# Altium footprint library Active.PcbLib: 325 footprints (part 15 of 23)
Each footprint in its own frame and in the unit in brackets; x right, y up, seen from the top. Pads: shape width x height; smd on the part's side, far side on the other; paste and mask are expansions set on the pad; w line width, h text height; cw(c..) or ccw(c..) is an arc to the next point about the centre after c.
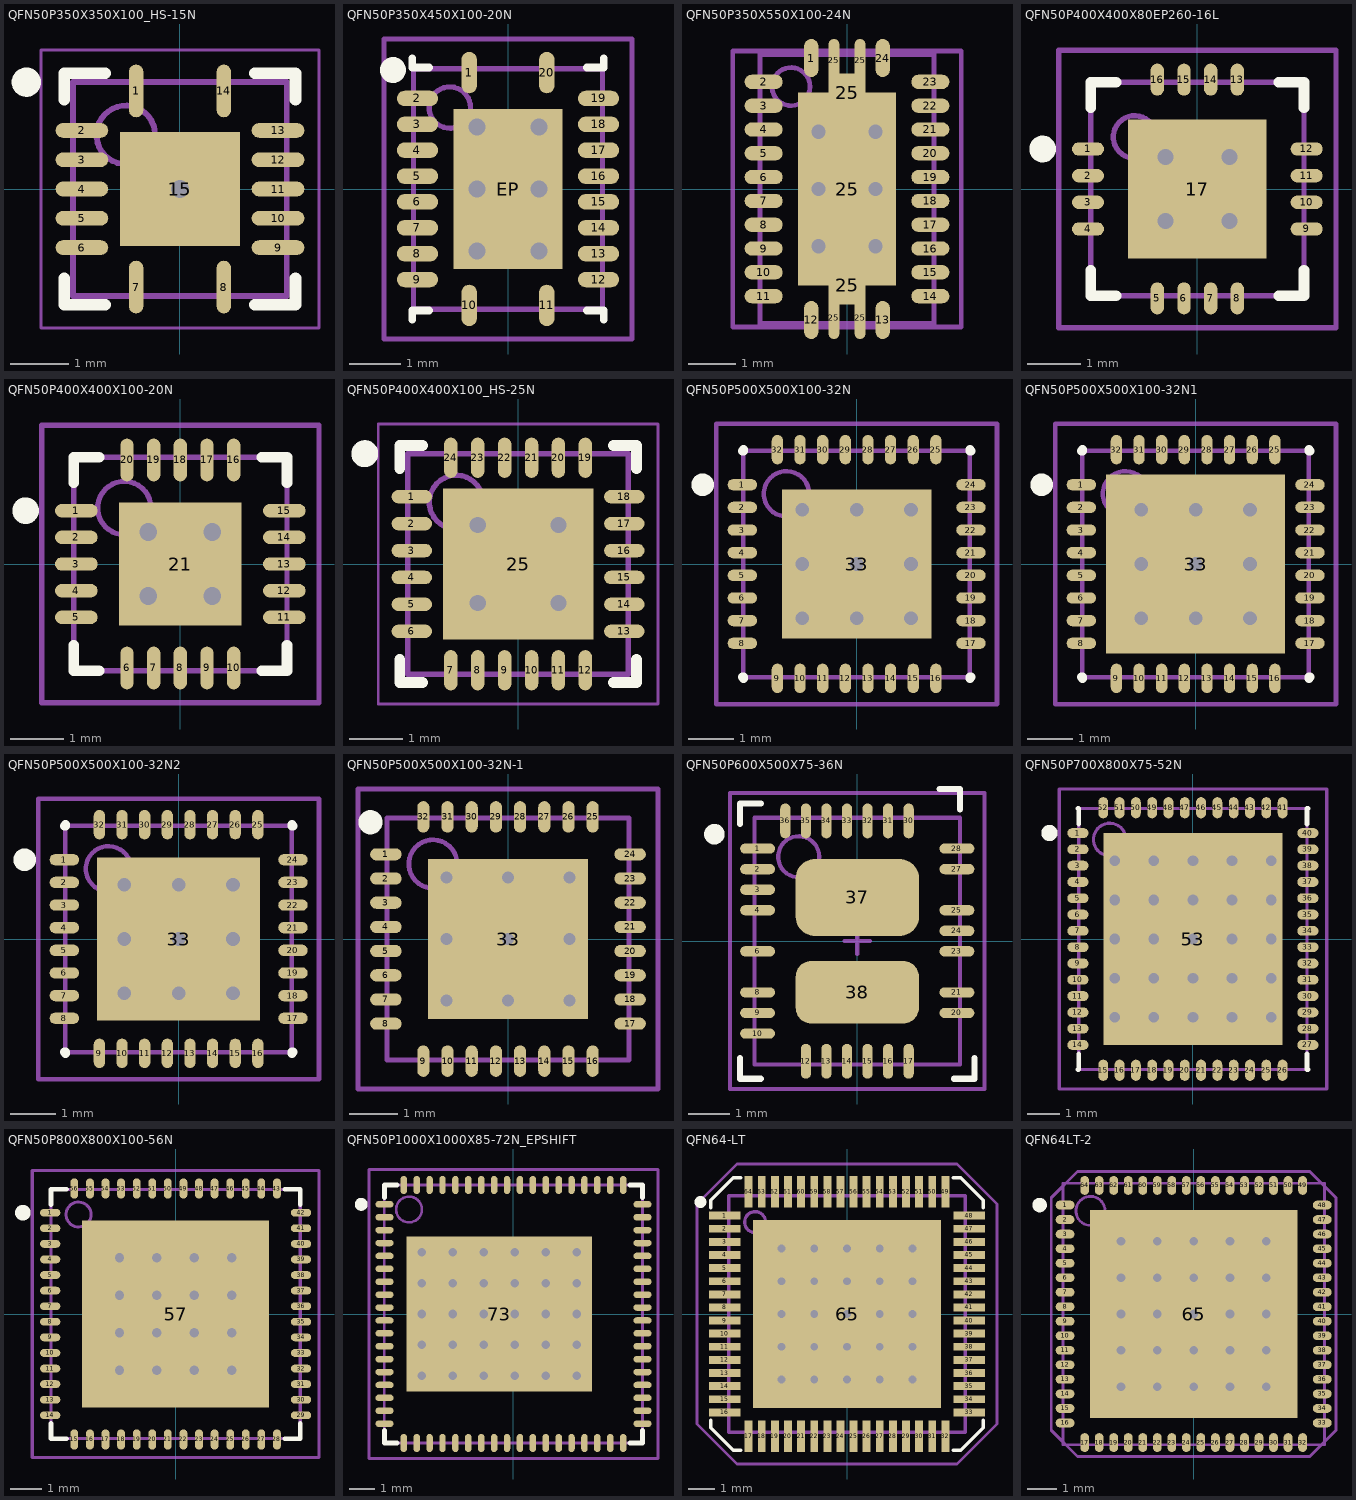
[diagram p14: the footprints below, top view; thin cyan lines are the x and y axes]

## QFN50P350X350X100_HS-15N [mm] "QFN, 14-Leads, Body 3,50x3,50mm, Pitch 1,50mm/0,50mm, Thermal Pad 2,05x1,95mm, IPC Medium Density"
height 1
pads (15):
  oval 0.25x0.9 smd: 1(-0.75,1.675) 7(-0.75,-1.675) 8(0.75,-1.675) 14(0.75,1.675)
  oval 0.9x0.25 smd: 2(-1.675,1) 3(-1.675,0.5) 4(-1.675,0) 5(-1.675,-0.5) 6(-1.675,-1) 9(1.675,-1) 10(1.675,-0.5) 11(1.675,0) 12(1.675,0.5) 13(1.675,1)
  rect 2.05x1.95 smd paste-5: 15(0,0)
via 0,0 diameter 0.65 hole 0.3
Top Overlay:
  circle w0.25: c-2.625,1.825 r0.125
  lines w0.2: -1.975,-1.525 -1.975,-1.975 -1.275,-1.975 ; -1.975,1.525 -1.975,1.975 -1.275,1.975 ; 1.275,-1.975 1.975,-1.975 1.975,-1.525 ; 1.275,1.975 1.975,1.975 1.975,1.525
Top Paste:
  region: 1.025,0.15 0.325,0.15 0.125,0.35 0.125,0.975 1.025,0.975
  region: 1.025,-0.15 0.325,-0.15 0.125,-0.35 0.125,-0.975 1.025,-0.975
  region: -1.025,-0.15 -0.325,-0.15 -0.125,-0.35 -0.125,-0.975 -1.025,-0.975
  region: -1.025,0.15 -0.325,0.15 -0.125,0.35 -0.125,0.975 -1.025,0.975
Mechanical 13:
  circle w0.1: c-0.925,0.925 r0.5
  lines w0.1: -1.825,-1.825 -1.825,1.825 1.825,1.825 1.825,-1.825 -1.825,-1.825
Mechanical 15:
  lines w0.05: -2.375,-2.375 -2.375,2.375 2.375,2.375 2.375,-2.375 -2.375,-2.375
  lines w0.1: -0.5,0 0.5,0 ; 0,-0.5 0,0.5
3D body: height 1.01, standoff 1, extent -1.5,0.9 -0.9,1.5
3D body: height 1, standoff 0.01, extent -1.825,-1.825 1.825,1.825

## QFN50P350X450X100-20N [mm] "QFN, 20-Leads, Body 4,7x3,7mm (max), Pitch 0,50mm, IPC Medium Density"
height 1
pads (21):
  oval 0.3x0.8 smd mask+0.051: 1(-0.75,2.25) 10(-0.75,-2.25) 11(0.75,-2.25) 20(0.75,2.25)
  oval 0.8x0.3 smd mask+0.051: 2(-1.75,1.75) 3(-1.75,1.25) 4(-1.75,0.75) 5(-1.75,0.25) 6(-1.75,-0.25) 7(-1.75,-0.75) 8(-1.75,-1.25) 9(-1.75,-1.75) 12(1.75,-1.75) 13(1.75,-1.25) 14(1.75,-0.75) 15(1.75,-0.25) 16(1.75,0.25) 17(1.75,0.75) 18(1.75,1.25) 19(1.75,1.75)
  rect 2.1x3.1 smd: EP(0,0)
via -0.6,1.2 diameter 0.66 hole 0.33
via 0.6,1.2 diameter 0.66 hole 0.33
via -0.6,0 diameter 0.66 hole 0.33
via 0.6,0 diameter 0.66 hole 0.33
via -0.6,-1.2 diameter 0.66 hole 0.33
via 0.6,-1.2 diameter 0.66 hole 0.33
Top Overlay:
  circle w0.25: c-2.225,2.3 r0.125
  lines w0.15: -1.85,-2.525 -1.85,-2.35 -1.525,-2.35 ; -1.85,2.525 -1.85,2.35 -1.525,2.35 ; 1.525,-2.35 1.85,-2.35 1.85,-2.525 ; 1.525,2.35 1.85,2.35 1.85,2.525
Mechanical 13:
  circle w0.1: c-1.125,1.575 r0.4
  lines w0.1: -1.825,-2.325 -1.825,2.325 1.825,2.325 1.825,-2.325 -1.825,-2.325
Mechanical 15:
  lines w0.1: -0.5,0 0.5,0 ; 0,-0.5 0,0.5 ; -2.4,-2.9 -2.4,2.9 2.4,2.9 2.4,-2.9 -2.4,-2.9
3D body: height 1, standoff 0.01, extent -1.825,-2.325 1.825,2.325
3D body: height 1.01, standoff 1, extent -1.525,1.175 -0.725,1.975

## QFN50P350X550X100-24N [mm] "QFN, 20-Leads, Body 5,5x3,5mm (max), Pitch 0,50mm, IPC Medium Density"
height 1
pads (31):
  oval 0.3x0.8 smd mask+0.051: 1(-0.75,2.75) 12(-0.75,-2.75) 13(0.75,-2.75) 24(0.75,2.75)
  oval 0.8x0.3 smd mask+0.051: 2(-1.75,2.25) 3(-1.75,1.75) 4(-1.75,1.25) 5(-1.75,0.75) 6(-1.75,0.25) 7(-1.75,-0.25) 8(-1.75,-0.75) 9(-1.75,-1.25) 10(-1.75,-1.75) 11(-1.75,-2.25) 14(1.75,-2.25) 15(1.75,-1.75) 16(1.75,-1.25) 17(1.75,-0.75) 18(1.75,-0.25) 19(1.75,0.25) 20(1.75,0.75) 21(1.75,1.25) 22(1.75,1.75) 23(1.75,2.25)
  oval 0.23x0.9 smd mask+0.051: 25(-0.275,-2.7) 25(-0.275,2.7) 25(0.275,-2.7) 25(0.275,2.7)
  rect 0.78x0.8 smd paste-7 mask+0.051: 25(0,-2.025) 25(0,2.025)
  rect 2.05x4.05 smd paste-7 mask-7: 25(0,0)
via 0.6,-1.2 diameter 0.65 hole 0.3
via -0.6,-1.2 diameter 0.65 hole 0.3
via 0.6,0 diameter 0.65 hole 0.3
via -0.6,0 diameter 0.65 hole 0.3
via 0.6,1.2 diameter 0.65 hole 0.3
via -0.6,1.2 diameter 0.65 hole 0.3
Top Paste:
  region: -1.025,0.825 1.025,0.825 1.025,0.2 0.875,0.2 0.75,0.325 0.45,0.325 0.325,0.2 -0.325,0.2 -0.45,0.325 -0.75,0.325 -0.875,0.2 -1.025,0.2
  region: -1.025,-0.375 1.025,-0.375 1.025,-1 0.875,-1 0.75,-0.875 0.45,-0.875 0.325,-1 -0.325,-1 -0.45,-0.875 -0.75,-0.875 -0.875,-1 -1.025,-1
  region: -1.025,-0.825 1.025,-0.825 1.025,-0.2 0.875,-0.2 0.75,-0.325 0.45,-0.325 0.325,-0.2 -0.325,-0.2 -0.45,-0.325 -0.75,-0.325 -0.875,-0.2 -1.025,-0.2
  region: -1.025,0.375 1.025,0.375 1.025,1 0.875,1 0.75,0.875 0.45,0.875 0.325,1 -0.325,1 -0.45,0.875 -0.75,0.875 -0.875,1 -1.025,1
  region: -1.025,-2.025 1.025,-2.025 1.025,-1.4 0.875,-1.4 0.75,-1.525 0.45,-1.525 0.325,-1.4 -0.325,-1.4 -0.45,-1.525 -0.75,-1.525 -0.875,-1.4 -1.025,-1.4
  region: -1.025,2.025 1.025,2.025 1.025,1.4 0.875,1.4 0.75,1.525 0.45,1.525 0.325,1.4 -0.325,1.4 -0.45,1.525 -0.75,1.525 -0.875,1.4 -1.025,1.4
Top Solder:
  circle w0.1: c0.6,-1.2 r0.4
  circle w0.1: c-0.6,-1.2 r0.4
  circle w0.1: c-0.6,0 r0.4
  circle w0.1: c0.6,0 r0.4
  circle w0.1: c0.6,1.2 r0.4
  circle w0.1: c-0.6,1.2 r0.4
  region: 1.075,0.6 1.075,-0.6 0,-0.6 0,0.6 0.538,0.6 0.538,0.413 0.5,0.375 0.4,0.375 0.2,0.175 0.2,-0.175 0.425,-0.4 0.75,-0.4 0.975,-0.175 0.975,0.175 0.75,0.4 0.575,0.4 0.538,0.437 0.538,0.6
  region: -1.075,0.6 -1.075,-0.6 0,-0.6 0,0.6 -0.537,0.6 -0.537,0.413 -0.5,0.375 -0.4,0.375 -0.2,0.175 -0.2,-0.175 -0.425,-0.4 -0.75,-0.4 -0.975,-0.175 -0.975,0.175 -0.75,0.4 -0.575,0.4 -0.537,0.437 -0.537,0.6
  region: -0.425,-2.075 -1.075,-2.075 -1.075,-0.6 0,-0.6 0,-2.075 -0.425,-2.075 -0.425,-1.55 -0.6,-1.6 -0.875,-1.475 -1.025,-1.25 -0.9,-0.975 -0.775,-0.85 -0.475,-0.825 -0.275,-1 -0.2,-1.2 -0.275,-1.45 -0.425,-1.55
  region: 0.425,-2.075 1.075,-2.075 1.075,-0.6 0,-0.6 0,-2.075 0.425,-2.075 0.425,-1.55 0.6,-1.6 0.875,-1.475 1.025,-1.25 0.9,-0.975 0.775,-0.85 0.475,-0.825 0.275,-1 0.2,-1.2 0.275,-1.45 0.425,-1.55
  region: 0.425,2.075 1.075,2.075 1.075,0.6 0,0.6 0,2.075 0.425,2.075 0.425,1.55 0.6,1.6 0.875,1.475 1.025,1.25 0.9,0.975 0.775,0.85 0.475,0.825 0.275,1 0.2,1.2 0.275,1.45 0.425,1.55
  region: -0.425,2.075 -1.075,2.075 -1.075,0.6 0,0.6 0,2.075 -0.425,2.075 -0.425,1.55 -0.6,1.6 -0.875,1.475 -1.025,1.25 -0.9,0.975 -0.775,0.85 -0.475,0.825 -0.275,1 -0.2,1.2 -0.275,1.45 -0.425,1.55
Mechanical 13:
  circle w0.1: c-1.175,2.15 r0.4
  lines w0.1: -1.825,-2.825 1.825,-2.825 1.825,2.825 -1.825,2.825 -1.825,-2.825
Mechanical 15:
  lines w0.1: -0.5,0 0.5,0 ; 0,-0.5 0,0.5 ; -2.4,-2.9 2.4,-2.9 2.4,2.9 -2.4,2.9 -2.4,-2.9
3D body: height 1.01, standoff 1, extent -1.575,1.75 -0.775,2.55
3D body: height 1, standoff 0.01, extent -1.825,-2.825 1.825,2.825

## QFN50P400X400X80EP260-16L [mm] "QFN, 16-Leads, Body 4,0x4,0mm (max), Pitch 0,50mm, IPC Medium Density"
height 0.8
pads (17):
  oval 0.6x0.25 smd mask+0.051: 1(-2.05,0.75) 2(-2.05,0.25) 3(-2.05,-0.25) 4(-2.05,-0.75) 9(2.05,-0.75) 10(2.05,-0.25) 11(2.05,0.25) 12(2.05,0.75)
  oval 0.25x0.6 smd mask+0.051: 5(-0.75,-2.05) 6(-0.25,-2.05) 7(0.25,-2.05) 8(0.75,-2.05) 13(0.75,2.05) 14(0.25,2.05) 15(-0.25,2.05) 16(-0.75,2.05)
  rect 2.6x2.6 smd paste-2 mask-2: 17(0,0)
via 0.6,-0.6 diameter 0.65 hole 0.3
via -0.6,-0.6 diameter 0.65 hole 0.3
via 0.6,0.6 diameter 0.65 hole 0.3
via -0.6,0.6 diameter 0.65 hole 0.3
Top Overlay:
  circle w0.25: c-2.9,0.75 r0.125
  lines w0.2: -2,-1.525 -2,-2 -1.525,-2 ; -2,1.525 -2,2 -1.525,2 ; 1.525,-2 2,-2 2,-1.525 ; 1.525,2 2,2 2,1.525
Top Paste:
  region: 1.3,1.3 1.3,0.75 0.925,0.75 0.75,0.925 0.75,1.3
  region: 1.3,-1.3 0.75,-1.3 0.75,-0.925 0.925,-0.75 1.3,-0.75
  region: -1.3,-1.3 -1.3,-0.75 -0.925,-0.75 -0.75,-0.925 -0.75,-1.3
  region: 0.45,1.3 0.45,0.925 0.275,0.75 -0.275,0.75 -0.45,0.925 -0.45,1.3
  region: 1.3,-0.45 0.925,-0.45 0.75,-0.275 0.75,0.275 0.925,0.45 1.3,0.45
  region: -0.45,-1.3 -0.45,-0.925 -0.275,-0.75 0.275,-0.75 0.45,-0.925 0.45,-1.3
  region: -1.3,1.3 -0.75,1.3 -0.75,0.925 -0.925,0.75 -1.3,0.75
  region: -0.45,0.275 -0.275,0.45 0.275,0.45 0.45,0.275 0.45,-0.275 0.275,-0.45 -0.275,-0.45 -0.45,-0.275
  region: -1.3,0.45 -0.925,0.45 -0.75,0.275 -0.75,-0.275 -0.925,-0.45 -1.3,-0.45
Top Solder:
  region: -1.35,1.35 -0.6,1.35 -0.6,0.925 -0.632,0.925 -0.727,0.906 -0.834,0.834 -0.906,0.727 -0.925,0.632 -0.925,0.6 -0.925,0.568 -0.906,0.473 -0.834,0.366 -0.727,0.294 -0.632,0.275 -0.6,0.275 -0.568,0.275 -0.473,0.294 -0.366,0.366 -0.294,0.473 -0.275,0.568 -0.275,0.6 -0.275,0.632 -0.294,0.727 -0.366,0.834 -0.473,0.906 -0.568,0.925 -0.6,0.925 -0.6,1.35 0,1.35 0,0 -1.35,0
  region: -1.35,-1.35 -1.35,-0.6 -0.925,-0.6 -0.925,-0.632 -0.906,-0.727 -0.834,-0.834 -0.727,-0.906 -0.632,-0.925 -0.6,-0.925 -0.568,-0.925 -0.473,-0.906 -0.366,-0.834 -0.294,-0.727 -0.275,-0.632 -0.275,-0.6 -0.275,-0.568 -0.294,-0.473 -0.366,-0.366 -0.473,-0.294 -0.568,-0.275 -0.6,-0.275 -0.632,-0.275 -0.727,-0.294 -0.834,-0.366 -0.906,-0.473 -0.925,-0.568 -0.925,-0.6 -1.35,-0.6 -1.35,0 0,0 0,-1.35
  region: 1.35,-1.35 0.6,-1.35 0.6,-0.925 0.632,-0.925 0.727,-0.906 0.834,-0.834 0.906,-0.727 0.925,-0.632 0.925,-0.6 0.925,-0.568 0.906,-0.473 0.834,-0.366 0.727,-0.294 0.632,-0.275 0.6,-0.275 0.568,-0.275 0.473,-0.294 0.366,-0.366 0.294,-0.473 0.275,-0.568 0.275,-0.6 0.275,-0.632 0.294,-0.727 0.366,-0.834 0.473,-0.906 0.568,-0.925 0.6,-0.925 0.6,-1.35 0,-1.35 0,0 1.35,0
  region: 1.35,1.35 1.35,0.6 0.925,0.6 0.925,0.632 0.906,0.727 0.834,0.834 0.727,0.906 0.632,0.925 0.6,0.925 0.568,0.925 0.473,0.906 0.366,0.834 0.294,0.727 0.275,0.632 0.275,0.6 0.275,0.568 0.294,0.473 0.366,0.366 0.473,0.294 0.568,0.275 0.6,0.275 0.632,0.275 0.727,0.294 0.834,0.366 0.906,0.473 0.925,0.568 0.925,0.6 1.35,0.6 1.35,0 0,0 0,1.35
Mechanical 13:
  circle w0.1: c-1.175,0.975 r0.4
  lines w0.1: -2,-2 2,-2 2,2 -2,2 -2,-2
Mechanical 15:
  lines w0.1: -0.5,0 0.5,0 ; 0,-0.5 0,0.5 ; -2.6,-2.6 2.6,-2.6 2.6,2.6 -2.6,2.6 -2.6,-2.6
3D body: height 0.8, standoff 0.01, extent -2,-2 2,2
3D body: height 0.81, standoff 0.8, extent -1.573,0.56 -0.775,1.373

## QFN50P400X400X100-20N [mm] "QFN, 20-Leads, Body 4,0x4,0mm (max), Pitch 0,50mm, IPC Medium Density"
height 1
pads (21):
  oval 0.8x0.25 smd mask+0.07: 1(-1.95,1) 2(-1.95,0.5) 3(-1.95,0) 4(-1.95,-0.5) 5(-1.95,-1) 11(1.95,-1) 12(1.95,-0.5) 13(1.95,0) 14(1.95,0.5) 15(1.95,1)
  oval 0.25x0.8 smd mask+0.07: 6(-1,-1.95) 7(-0.5,-1.95) 8(0,-1.95) 9(0.5,-1.95) 10(1,-1.95) 16(1,1.95) 17(0.5,1.95) 18(0,1.95) 19(-0.5,1.95) 20(-1,1.95)
  rect 2.3x2.3 smd paste-7 mask-7: 21(0,0)
via 0.6,-0.6 diameter 0.66 hole 0.33
via -0.6,-0.6 diameter 0.66 hole 0.33
via 0.6,0.6 diameter 0.66 hole 0.33
via -0.6,0.6 diameter 0.66 hole 0.33
Top Overlay:
  circle w0.25: c-2.9,1 r0.125
  lines w0.2: -2,-1.525 -2,-2 -1.525,-2 ; -2,1.525 -2,2 -1.525,2 ; 1.525,-2 2,-2 2,-1.525 ; 1.525,2 2,2 2,1.525
Top Paste:
  region: -1.27,1.27 -0.686,1.27 -0.686,0.991 -0.965,0.711 -1.27,0.711
  region: 1.27,1.27 0.686,1.27 0.686,0.991 0.965,0.711 1.27,0.711
  region: 1.27,-1.27 0.686,-1.27 0.686,-0.991 0.965,-0.711 1.27,-0.711
  region: -1.27,-1.27 -0.686,-1.27 -0.686,-0.991 -0.965,-0.711 -1.27,-0.711
  region: -0.508,1.27 -0.508,0.991 -0.229,0.711 0.229,0.711 0.508,0.991 0.508,1.27
  region: -0.508,-1.27 -0.508,-0.991 -0.229,-0.711 0.229,-0.711 0.508,-0.991 0.508,-1.27
  region: 1.27,-0.508 0.991,-0.508 0.711,-0.229 0.711,0.229 0.991,0.508 1.27,0.508
  region: -1.27,-0.508 -0.991,-0.508 -0.711,-0.229 -0.711,0.229 -0.991,0.508 -1.27,0.508
  region: -0.203,0.533 0.203,0.533 0.457,0.279 0.457,-0.254 0.203,-0.508 -0.203,-0.508 -0.457,-0.254 -0.457,0.279
Top Solder:
  circle w0.1: c-0.6,0.6 r0.4
  circle w0.1: c0.6,0.6 r0.4
  circle w0.1: c0.6,-0.6 r0.4
  circle w0.1: c-0.6,-0.6 r0.4
  region: -1.27,1.27 0,1.27 0,0 -1.27,0 -1.27,0.508 -1.016,0.508 -0.889,0.33 -0.787,0.254 -0.66,0.178 -0.559,0.178 -0.432,0.254 -0.254,0.381 -0.2,0.6 -0.229,0.762 -0.305,0.889 -0.457,0.991 -0.66,0.991 -0.838,0.914 -0.991,0.737 -0.991,0.508 -1.27,0.508
  region: 1.27,1.27 0,1.27 0,0 1.27,0 1.27,0.508 1.016,0.508 0.889,0.33 0.787,0.254 0.66,0.178 0.559,0.178 0.432,0.254 0.254,0.381 0.2,0.6 0.229,0.762 0.305,0.889 0.457,0.991 0.66,0.991 0.838,0.914 0.991,0.737 0.991,0.508 1.27,0.508
  region: 1.27,-1.27 0,-1.27 0,0 1.27,0 1.27,-0.508 1.016,-0.508 0.889,-0.33 0.787,-0.254 0.66,-0.178 0.559,-0.178 0.432,-0.254 0.254,-0.381 0.2,-0.6 0.229,-0.762 0.305,-0.889 0.457,-0.991 0.66,-0.991 0.838,-0.914 0.991,-0.737 0.991,-0.508 1.27,-0.508
  region: -1.27,-1.27 0,-1.27 0,0 -1.27,0 -1.27,-0.508 -1.016,-0.508 -0.889,-0.33 -0.787,-0.254 -0.66,-0.178 -0.559,-0.178 -0.432,-0.254 -0.254,-0.381 -0.2,-0.6 -0.229,-0.762 -0.305,-0.889 -0.457,-0.991 -0.66,-0.991 -0.838,-0.914 -0.991,-0.737 -0.991,-0.508 -1.27,-0.508
Mechanical 13:
  circle w0.1: c-1.05,1.05 r0.5
  lines w0.1: -2,-2 2,-2 2,2 -2,2 -2,-2
Mechanical 15:
  lines w0.1: -0.5,0 0.5,0 ; 0,-0.5 0,0.5 ; -2.6,-2.6 2.6,-2.6 2.6,2.6 -2.6,2.6 -2.6,-2.6
3D body: height 1.01, standoff 1, extent -1.575,0.925 -0.975,1.525
3D body: height 1, standoff 0.01, extent -2,-2 2,2

## QFN50P400X400X100_HS-25N [mm] "QFN, 24-Leads, Body 4.00x4.00mm, Pitch 0.50mm, Thermal Pad 2.80x2.100mm, IPC Medium Density"
height 1
pads (25):
  oval 0.75x0.25 smd mask+0.075: 1(-1.975,1.25) 2(-1.975,0.75) 3(-1.975,0.25) 4(-1.975,-0.25) 5(-1.975,-0.75) 6(-1.975,-1.25) 13(1.975,-1.25) 14(1.975,-0.75) 15(1.975,-0.25) 16(1.975,0.25) 17(1.975,0.75) 18(1.975,1.25)
  oval 0.25x0.75 smd mask+0.075: 7(-1.25,-1.975) 8(-0.75,-1.975) 9(-0.25,-1.975) 10(0.25,-1.975) 11(0.75,-1.975) 12(1.25,-1.975) 19(1.25,1.975) 20(0.75,1.975) 21(0.25,1.975) 22(-0.25,1.975) 23(-0.75,1.975) 24(-1.25,1.975)
  rect 2.8x2.8 smd paste-5 mask-5: 25(0,0)
via 0.75,-0.725 diameter 0.65 hole 0.3
via -0.75,-0.725 diameter 0.65 hole 0.3
via 0.75,0.725 diameter 0.65 hole 0.3
via -0.75,0.725 diameter 0.65 hole 0.3
Top Overlay:
  circle w0.25: c-2.85,2.05 r0.125
  lines w0.2: -2.2,-1.775 -2.2,-2.2 -1.775,-2.2 ; -2.2,1.775 -2.2,2.2 -1.775,2.2 ; 1.775,-2.2 2.2,-2.2 2.2,-1.775 ; 1.775,2.2 2.2,2.2 2.2,1.775
Top Paste:
  region: 0.1,-0.65 -0.375,-0.65 -0.675,-0.35 -0.675,-0.05 0.1,-0.05
  region: -1.4,-0.65 -1.125,-0.65 -0.825,-0.35 -0.825,-0.05 -1.4,-0.05
  region: -1.4,-0.8 -1.125,-0.8 -0.825,-1.1 -0.825,-1.4 -1.4,-1.4
  region: 0.1,-0.8 -0.375,-0.8 -0.675,-1.1 -0.675,-1.4 0.1,-1.4
  region: 1.4,-0.65 1.125,-0.65 0.825,-0.35 0.825,-0.05 1.4,-0.05
  region: 0.1,-0.65 0.375,-0.65 0.675,-0.35 0.675,-0.05 0.1,-0.05
  region: 0.1,-0.8 0.375,-0.8 0.675,-1.1 0.675,-1.4 0.1,-1.4
  region: 1.4,-0.8 1.125,-0.8 0.825,-1.1 0.825,-1.4 1.4,-1.4
  region: 1.4,0.8 1.125,0.8 0.825,1.1 0.825,1.4 1.4,1.4
  region: -0.1,0.8 0.375,0.8 0.675,1.1 0.675,1.4 -0.1,1.4
  region: 0.1,0.65 0.375,0.65 0.675,0.35 0.675,-0.05 0.1,-0.05
  region: 1.4,0.65 1.125,0.65 0.825,0.35 0.825,-0.05 1.4,-0.05
  region: -1.4,0.65 -1.125,0.65 -0.825,0.35 -0.825,-0.05 -1.4,-0.05
  region: 0.1,0.65 -0.375,0.65 -0.675,0.35 -0.675,-0.05 0.1,-0.05
  region: -0.1,0.8 -0.375,0.8 -0.675,1.1 -0.675,1.4 -0.1,1.4
  region: -1.4,0.8 -1.125,0.8 -0.825,1.1 -0.825,1.4 -1.4,1.4
Top Solder:
  drawing of 8 lines, arcs and shapes, not listed
Mechanical 13:
  circle w0.1: c-1.15,1.15 r0.5
  lines w0.1: -2.05,-2.05 -2.05,2.05 2.05,2.05 2.05,-2.05 -2.05,-2.05
Mechanical 15:
  lines w0.05: -2.6,-2.6 -2.6,2.6 2.6,2.6 2.6,-2.6 -2.6,-2.6
  lines w0.1: -0.5,0 0.5,0 ; 0,-0.5 0,0.5
3D body: height 1, standoff 0.05, extent -2.05,-2.05 2.05,2.05
3D body: height 1.01, standoff 1, extent -1.649,0.625 -0.65,1.625

## QFN50P500X500X100-32N [mm] "QFN, 32-Leads, Body 5,0x5,0mm (max), Pitch 0,50mm, IPC Medium Density"
height 1
pads (33):
  oval 0.65x0.25 smd mask+0.051: 1(-2.525,1.75) 2(-2.525,1.25) 3(-2.525,0.75) 4(-2.525,0.25) 5(-2.525,-0.25) 6(-2.525,-0.75) 7(-2.525,-1.25) 8(-2.525,-1.75) 17(2.525,-1.75) 18(2.525,-1.25) 19(2.525,-0.75) 20(2.525,-0.25) 21(2.525,0.25) 22(2.525,0.75) 23(2.525,1.25) 24(2.525,1.75)
  oval 0.25x0.65 smd mask+0.051: 9(-1.75,-2.525) 10(-1.25,-2.525) 11(-0.75,-2.525) 12(-0.25,-2.525) 13(0.25,-2.525) 14(0.75,-2.525) 15(1.25,-2.525) 16(1.75,-2.525) 25(1.75,2.525) 26(1.25,2.525) 27(0.75,2.525) 28(0.25,2.525) 29(-0.25,2.525) 30(-0.75,2.525) 31(-1.25,2.525) 32(-1.75,2.525)
  rect 3.3x3.3 smd paste-7 mask-7: 33(0,0)
via -1.2,1.2 diameter 0.65 hole 0.3
via 0,1.2 diameter 0.65 hole 0.3
via 1.2,1.2 diameter 0.65 hole 0.3
via -1.2,0 diameter 0.65 hole 0.3
via 0,0 diameter 0.65 hole 0.3
via 1.2,0 diameter 0.65 hole 0.3
via -1.2,-1.2 diameter 0.65 hole 0.3
via 0,-1.2 diameter 0.65 hole 0.3
via 1.2,-1.2 diameter 0.65 hole 0.3
Top Overlay:
  circle w0.25: c-3.4,1.75 r0.125
  lines w0.2: -2.525,-2.5 -2.5,-2.5 -2.5,-2.525 ; -2.525,2.5 -2.5,2.5 -2.5,2.525 ; 2.5,-2.525 2.5,-2.5 2.525,-2.5 ; 2.5,2.525 2.5,2.5 2.525,2.5
Top Paste:
  region: -1.041,0.914 -0.889,1.067 -0.305,1.067 -0.152,0.914 -0.152,0.279 -0.305,0.127 -0.889,0.127 -1.041,0.279
  region: 1.041,0.914 0.889,1.067 0.305,1.067 0.152,0.914 0.152,0.279 0.305,0.127 0.889,0.127 1.041,0.279
  region: 1.041,-0.914 0.889,-1.067 0.305,-1.067 0.152,-0.914 0.152,-0.279 0.305,-0.127 0.889,-0.127 1.041,-0.279
  region: -1.041,-0.914 -0.889,-1.067 -0.305,-1.067 -0.152,-0.914 -0.152,-0.279 -0.305,-0.127 -0.889,-0.127 -1.041,-0.279
  region: -0.889,1.346 -1.016,1.473 -1.016,1.651 -0.152,1.651 -0.152,1.499 -0.305,1.346
  region: 0.305,1.346 0.178,1.473 0.178,1.651 1.041,1.651 1.041,1.499 0.889,1.346
  region: 1.321,0.864 1.448,0.991 1.626,0.991 1.626,0.127 1.473,0.127 1.321,0.279
  region: 1.321,-0.33 1.448,-0.203 1.626,-0.203 1.626,-1.067 1.473,-1.067 1.321,-0.914
  region: 0.889,-1.346 1.016,-1.473 1.016,-1.651 0.152,-1.651 0.152,-1.499 0.305,-1.346
  region: -0.305,-1.346 -0.178,-1.473 -0.178,-1.651 -1.041,-1.651 -1.041,-1.499 -0.889,-1.346
  region: -1.321,-0.864 -1.448,-0.991 -1.626,-0.991 -1.626,-0.127 -1.473,-0.127 -1.321,-0.279
  region: -1.321,0.33 -1.448,0.203 -1.626,0.203 -1.626,1.067 -1.473,1.067 -1.321,0.914
Top Solder:
  drawing of 18 lines, arcs and shapes, not listed
Mechanical 13:
  circle w0.1: c-1.55,1.55 r0.5
  lines w0.1: -2.5,-2.5 -2.5,2.5 2.5,2.5 2.5,-2.5 -2.5,-2.5
Mechanical 15:
  lines w0.1: -0.5,0 0.5,0 ; 0,-0.5 0,0.5 ; -3.1,-3.1 -3.1,3.1 3.1,3.1 3.1,-3.1 -3.1,-3.1
3D body: height 1, standoff 0.05, extent -2.5,-2.5 2.5,2.5
3D body: height 1.01, standoff 1, extent -2.047,1.041 -1.051,2.039
